# Altium footprint library my Library.PcbLib: 1247 footprints (part 13 of 78)
Each footprint in its own frame and in the unit in brackets; x right, y up, seen from the top. Pads: shape width x height; smd on the part's side, far side on the other; paste and mask are expansions set on the pad; w line width, h text height; cw(c..) or ccw(c..) is an arc to the next point about the centre after c.
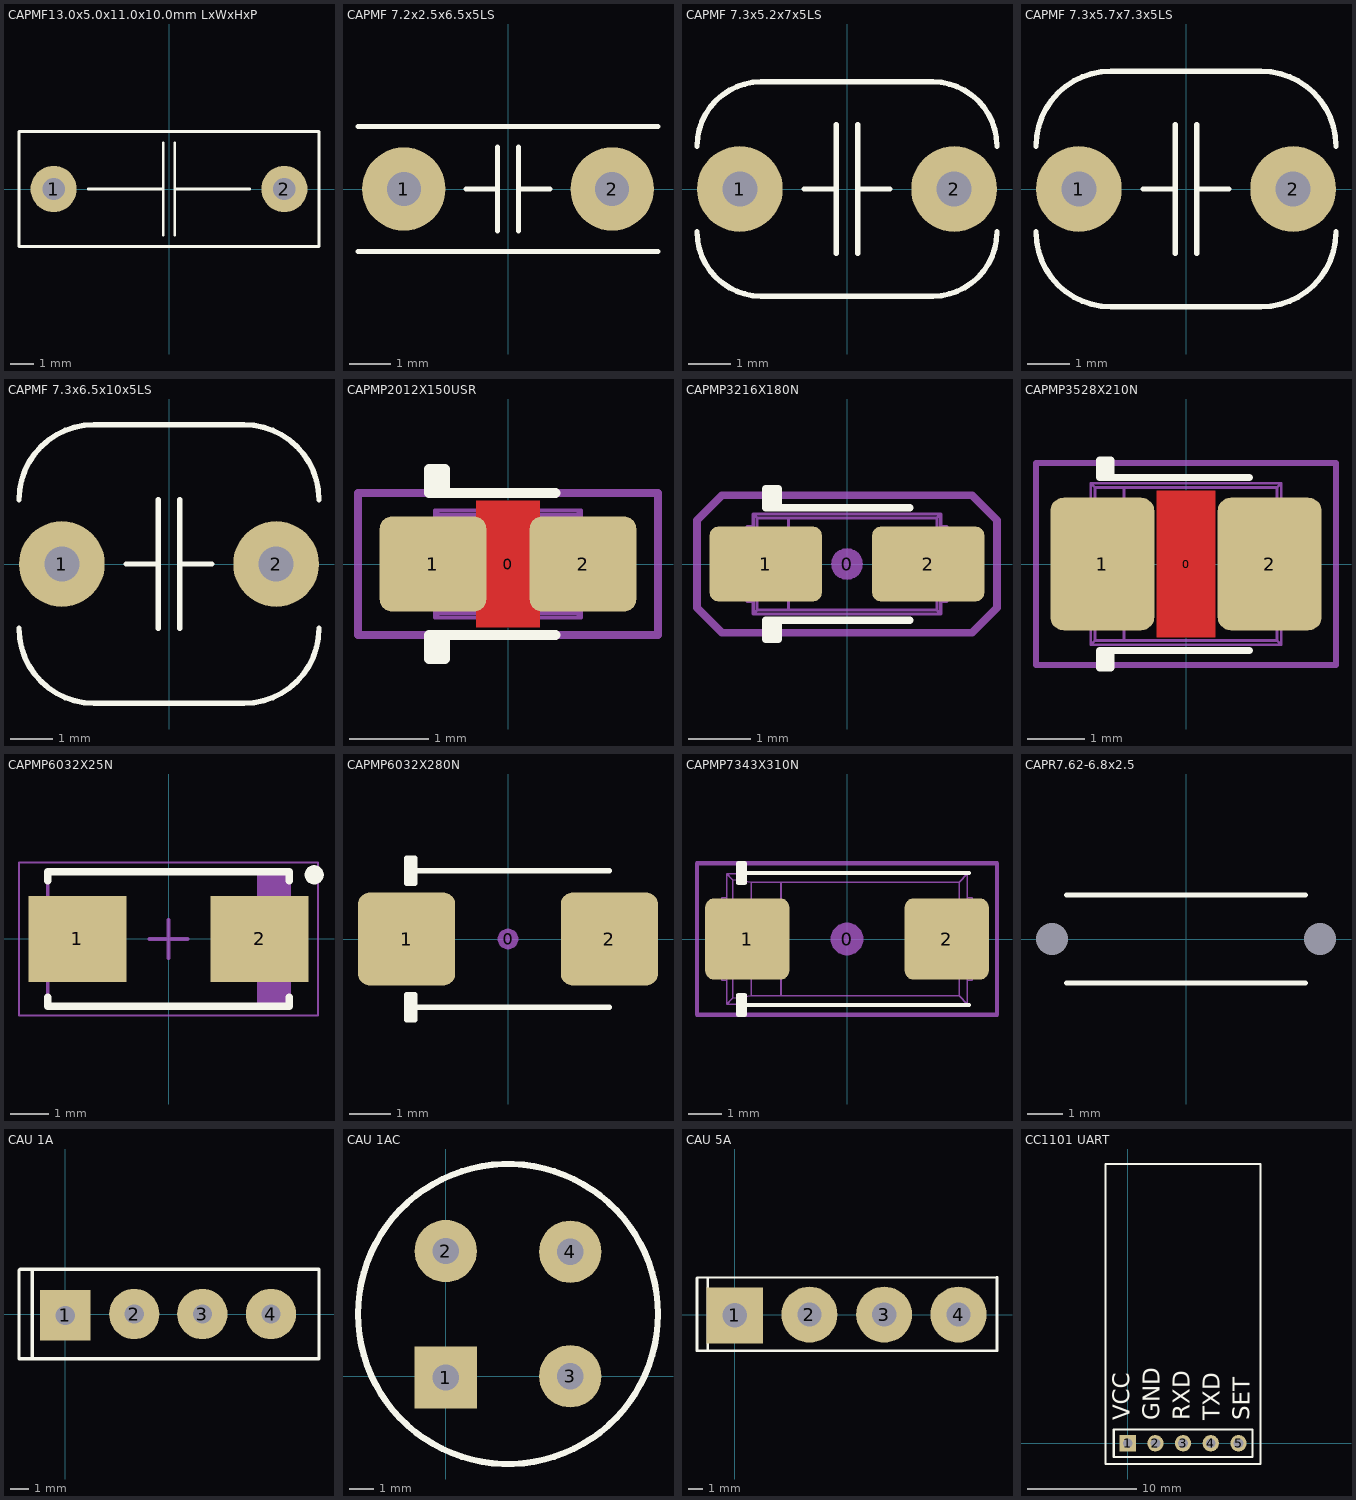
[diagram p12: the footprints below, top view; thin cyan lines are the x and y axes]

## CAPMF13.0x5.0x11.0x10.0mm LxWxHxP [mm] "Capacitor, THT, Metallized Polypropylene Film, 10mm lead pitch"
height 11
pads (2):
  round 2 hole 0.965: 1(-5,0) 2(5,0)
Top Overlay:
  lines w0.127: -3.5,0 -0.25,0 ; -0.25,-2 -0.25,2 ; 0.25,-2 0.25,2 ; 0.25,0 3.5,0 ; -6.5,-2.5 -6.5,2.5 6.5,2.5 6.5,-2.5 -6.5,-2.5
3D body: height 11, standoff 0, extent -6.5,-2.5 6.5,2.5

## CAPMF 7.2x2.5x6.5x5LS [mm] "Capacitor, THT, Metallized Polyester Film"
height 8.2
pads (2):
  round 2 hole 0.813: 1(-2.5,0) 2(2.5,0)
Top Overlay:
  lines w0.127: -3.6,-1.5 3.6,-1.5 ; -3.6,1.5 3.6,1.5 ; -1,0 -0.25,0 ; -0.25,-1 -0.25,1 ; 0.25,-1 0.25,1 ; 0.25,0 1,0
3D body "Cap, film, 7.2x2.5x6.5x5LS.STEP": height 7.5, standoff -2, extent -3.6,-1.25 3.6,1.25

## CAPMF 7.3x5.2x7x5LS [mm] "Capacitor, THT, Metallized Polyester Film"
height 7
pads (2):
  round 2 hole 0.813: 1(-2.5,0) 2(2.5,0)
Top Overlay:
  lines w0.127: -3.5,-1 ccw(c-2,-1) -2,-2.5 2,-2.5 ccw(c2,-1) 3.5,-1 ; -3.5,1 cw(c-2,1) -2,2.5 2,2.5 cw(c2,1) 3.5,1 ; -1,0 -0.25,0 ; -0.25,-1.5 -0.25,1.5 ; 0.25,-1.5 0.25,1.5 ; 0.25,0 1,0
3D body "Cap, film, 7.3x5.2x7x5LS.STP": height 8, standoff -2, extent -3.65,-2.6 3.65,2.6

## CAPMF 7.3x5.7x7.3x5LS [mm] "Capacitor, THT, Metallized Polyester Film"
height 7
pads (2):
  round 2 hole 0.813: 1(-2.5,0) 2(2.5,0)
Top Overlay:
  lines w0.127: -3.5,-1 ccw(c-1.75,-1) -1.75,-2.75 1.75,-2.75 ccw(c1.75,-1) 3.5,-1 ; -3.5,1 cw(c-1.75,1) -1.75,2.75 1.75,2.75 cw(c1.75,1) 3.5,1 ; -1,0 -0.25,0 ; -0.25,-1.5 -0.25,1.5 ; 0.25,-1.5 0.25,1.5 ; 0.25,0 1,0
3D body "Cap, film, 7.3x5.7x7.3x5LS.STP": height 8.3, standoff -2, extent -3.65,-2.85 3.65,2.85

## CAPMF 7.3x6.5x10x5LS [mm] "Capacitor, THT, Metallized Polyester Film"
height 10
pads (2):
  round 2 hole 0.813: 1(-2.5,0) 2(2.5,0)
Top Overlay:
  lines w0.127: -3.5,-1.5 ccw(c-1.75,-1.5) -1.75,-3.25 1.75,-3.25 ccw(c1.75,-1.5) 3.5,-1.5 ; -3.5,1.5 cw(c-1.75,1.5) -1.75,3.25 1.75,3.25 cw(c1.75,1.5) 3.5,1.5 ; -1,0 -0.25,0 ; -0.25,-1.5 -0.25,1.5 ; 0.25,-1.5 0.25,1.5 ; 0.25,0 1,0
3D body "Cap, film, 7.3x6.5x10x5LS.STP": height 11, standoff -2, extent -3.65,-3.25 3.65,3.25

## CAPMP2012X150USR [mm] "Molded body capacitor, Body 2.0x1.2mm, 0805, IPC Medium Density"
height 1.5
pads (3):
  round 0.254 on Mech15: 0(0,0)
  rrect25% 1.35x1.2 smd: 1(-0.95,0) 2(0.95,0)
Top Layer:
  pour cut-out: -0.4,0.8 0.4,0.8 0.4,-0.8 -0.4,-0.8
Top Overlay:
  lines w0.127: -0.9,-1.2 -0.9,-0.9 ; -0.9,0.9 -0.9,1.2 ; -0.8,-0.9 -0.8,-1.2 -1,-1.2 -1,-0.9 0.6,-0.9 ; -0.8,0.9 -0.8,1.2 -1,1.2 -1,0.9 0.6,0.9
Mechanical 13:
  lines w0.05: -1.025,-0.25 -0.925,-0.25 ; -1.025,0.25 -0.925,0.25 ; -0.925,-0.5 -1.025,-0.5 -1.025,0.5 -0.925,0.5 ; -0.373,-0.623 -0.373,0.623 ; 0.925,-0.5 1.025,-0.5 1.025,0.5 0.925,0.5 ; 0.925,-0.25 1.025,-0.25 ; 0.925,0.25 1.025,0.25 ; -0.925,-0.675 0.925,-0.675 ; -0.925,-0.675 -0.925,0.675 ; -0.925,-0.675 -0.873,-0.623 ; -0.925,0.675 0.925,0.675 ; -0.925,0.675 -0.873,0.623 ; -0.873,-0.623 0.873,-0.623 ; -0.873,-0.623 -0.873,0.623 ; -0.873,0.623 0.873,0.623 ; 0.873,-0.623 0.925,-0.675 ; 0.873,-0.623 0.873,0.623 ; 0.873,0.623 0.925,0.675 ; 0.925,-0.675 0.925,0.675
Mechanical 15:
  lines w0.1: -1.9,-0.9 1.9,-0.9 1.9,0.9 -1.9,0.9 -1.9,-0.9
3D body "CAPMP2012X150N.STEP": height 1.5, standoff 0, extent -1.025,-0.675 1.025,0.675

## CAPMP3216X180N [mm] "Capacitor, polarized, Molded Body, EIA 535BAAC size A; 3.20mm L X 1.60mm W X 1.80mm H"
height 1.8
pads (3):
  round 0.508 on Mech15: 0(0,0)
  rrect25% 1.8x1.2 smd: 1(-1.3,0) 2(1.3,0)
Top Overlay:
  lines w0.127: -1.2,-1.2 -1.2,-0.9 ; -1.2,0.9 -1.2,1.2 ; -1.1,-0.9 -1.1,-1.2 -1.3,-1.2 -1.3,-0.9 1,-0.9 ; -1.1,0.9 -1.1,1.2 -1.3,1.2 -1.3,0.9 1,0.9
Mechanical 13:
  lines w0.05: -1.6,-0.36 -1.499,-0.36 ; -1.6,0.36 -1.499,0.36 ; -1.499,-0.6 -1.6,-0.6 -1.6,0.6 -1.499,0.6 ; -0.937,-0.737 -0.937,0.737 ; 1.499,-0.6 1.6,-0.6 1.6,0.6 1.499,0.6 ; 1.499,-0.36 1.6,-0.36 ; 1.499,0.36 1.6,0.36 ; -1.5,-0.8 -1.437,-0.737 ; -1.5,-0.8 1.5,-0.8 ; -1.5,-0.8 -1.5,0.8 ; -1.5,0.8 -1.437,0.737 ; -1.5,0.8 1.5,0.8 ; -1.437,-0.737 1.437,-0.737 ; -1.437,-0.737 -1.437,0.737 ; -1.437,0.737 1.437,0.737 ; 1.437,-0.737 1.5,-0.8 ; 1.437,-0.737 1.437,0.737 ; 1.437,0.737 1.5,0.8 ; 1.5,-0.8 1.5,0.8
Mechanical 15:
  lines w0.127: -2.4,-0.7 -2.4,0.7 -2,1.1 2,1.1 2.4,0.7 2.4,-0.7 2,-1.1 -2,-1.1 -2.4,-0.7
3D body "CAPMP3216X180N.STEP": height 1.8, standoff 0, extent -1.6,-0.8 1.6,0.8

## CAPMP3528X210N [mm] "Molded body capacitor, Body 3.5x2.8mm, 1210, IPC Nominal settings"
height 2.1
pads (3):
  round 0.254 on Mech15: 0(0,0)
  rrect25% 1.8x2.3 smd: 1(-1.45,0) 2(1.45,0)
Top Layer:
  pour cut-out: -0.508,1.27 0.508,1.27 0.508,-1.27 -0.508,-1.27
Top Overlay:
  lines w0.127: -1.4,-1.8 -1.4,-1.5 ; -1.4,1.5 -1.4,1.8 ; -1.3,-1.5 -1.3,-1.8 -1.5,-1.8 -1.5,-1.5 1.1,-1.5 ; -1.3,1.5 -1.3,1.8 -1.5,1.8 -1.5,1.5 1.1,1.5
Mechanical 13:
  lines w0.05: -1.75,-0.55 -1.65,-0.55 ; -1.75,0.55 -1.65,0.55 ; -1.65,-1.1 -1.75,-1.1 -1.75,1.1 -1.65,1.1 ; -1.077,-1.327 -1.077,1.327 ; 1.65,-1.1 1.75,-1.1 1.75,1.1 1.65,1.1 ; 1.65,-0.55 1.75,-0.55 ; 1.65,0.55 1.75,0.55 ; -1.65,-1.4 1.65,-1.4 ; -1.65,-1.4 -1.65,1.4 ; -1.65,-1.4 -1.577,-1.327 ; -1.65,1.4 1.65,1.4 ; -1.65,1.4 -1.577,1.327 ; -1.577,-1.327 1.577,-1.327 ; -1.577,-1.327 -1.577,1.327 ; -1.577,1.327 1.577,1.327 ; 1.577,-1.327 1.65,-1.4 ; 1.577,-1.327 1.577,1.327 ; 1.577,1.327 1.65,1.4 ; 1.65,-1.4 1.65,1.4
Mechanical 15:
  lines w0.1: -2.6,-1.75 2.6,-1.75 2.6,1.75 -2.6,1.75 -2.6,-1.75
3D body "CAPMP3528X210N.STEP": height 2.1, standoff 0, extent -1.75,-1.4 1.75,1.4

## CAPMP6032X25N [mm] "Molded Capacitor, 2-Leads, Body 6.00x3.20mm, IPC Medium Density"
height 2.5
pads (2):
  rect 2.55x2.25 smd: 1(-2.375,0) 2(2.375,0)
Top Overlay:
  circle w0.25: c3.8,1.675 r0.125
  lines w0.2: -3.15,-1.525 -3.15,-1.75 3.15,-1.75 3.15,-1.525 ; -3.15,1.525 -3.15,1.75 3.15,1.75 3.15,1.525
Mechanical 13:
  rectangle: 2.303,-1.75 3.15,1.75
  lines w0.1: -3.15,-1.75 3.15,-1.75 3.15,1.75 -3.15,1.75 -3.15,-1.75
Mechanical 15:
  lines w0.05: -3.9,-2 3.9,-2 3.9,2 -3.9,2 -3.9,-2
  lines w0.1: -0.5,0 0.5,0 ; 0,-0.5 0,0.5
3D body "CAPMP6032X25N.step": height 2.5, standoff 0, extent -3.37,-1.75 3.37,1.75

## CAPMP6032X280N [mm] "Capacitor, polarized, Molded Body, EIA 535BAAC size C; 6.00mm L X 3.20mm W X 2.80mm H"
height 2.8
pads (3):
  round 0.508 on Mech15: 0(0,0)
  rrect25% 2.35x2.25 smd: 1(-2.45,0) 2(2.45,0)
Top Overlay:
  lines w0.127: -2.45,-1.65 2.45,-1.65 ; -2.45,1.65 2.45,1.65 ; -2.35,-1.95 -2.35,-1.65 -2.35,-1.35 ; -2.35,1.35 -2.35,1.65 -2.35,1.95 ; -2.45,-1.95 -2.25,-1.95 -2.25,-1.65 -2.25,-1.35 -2.45,-1.35 -2.45,-1.95 ; -2.45,1.35 -2.25,1.35 -2.25,1.65 -2.25,1.95 -2.45,1.95 -2.45,1.35
3D body: height 2.8, standoff 0, extent -3,-1.6 3,1.6

## CAPMP7343X310N [mm] "Molded body capacitor, Body 7.3x4.3mm, 2917, IPC Nominal settings"
height 3.1
pads (3):
  round 1 on Mech15: 0(0,0)
  rrect20% 2.55x2.45 smd: 1(-3.025,0) 2(3.025,0)
Top Overlay:
  lines w0.127: -3.3,-2 3.7,-2 ; -3.3,2 3.7,2 ; -3.2,-2.3 -3.2,-2 -3.2,-1.7 ; -3.2,1.7 -3.2,2 -3.2,2.3 ; -3.3,-2.3 -3.1,-2.3 -3.1,-2 -3.1,-1.7 -3.3,-1.7 -3.3,-2.3 ; -3.3,1.7 -3.1,1.7 -3.1,2 -3.1,2.3 -3.3,2.3 -3.3,1.7
Mechanical 13:
  lines w0.05: -3.8,-0.5 -3.65,-0.5 ; -3.8,0.5 -3.65,0.5 ; -3.67,-0.5 -3.67,0.5 ; -3.65,-1.25 -3.8,-1.25 -3.8,1.25 -3.65,1.25 ; -2.901,-0.575 -2.901,0.575 ; 3.65,-1.25 3.8,-1.25 3.8,1.25 3.65,1.25 ; 3.65,-0.5 3.8,-0.5 ; 3.65,0.5 3.8,0.5 ; 3.67,-0.5 3.67,0.5 ; -3.65,-1.975 3.65,-1.975 ; -3.65,-1.975 -3.471,-1.796 ; -3.65,-1.975 -3.65,1.975 ; -3.65,1.975 -3.471,1.796 ; -3.65,1.975 3.65,1.975 ; -3.471,-1.796 -2.907,-1.727 ; -3.471,-1.796 -3.471,1.796 ; -3.471,1.796 -2.907,1.727 ; -2.907,-1.727 -2.001,-1.727 ; -2.907,-1.727 -2.907,-0.575 -2.001,-0.575 -2.001,-1.727 ; -2.907,1.727 -2.001,1.727 ; -2.907,1.727 -2.907,0.575 -2.001,0.575 -2.001,1.727 ; -2.001,-1.727 3.401,-1.726 ; -2.001,1.727 3.401,1.726 ; 3.401,-1.726 3.65,-1.975 ; 3.401,-1.726 3.401,1.726 ; 3.401,1.726 3.65,1.975 ; 3.65,-1.975 3.65,1.975
Mechanical 15:
  lines w0.127: -4.55,-2.3 4.55,-2.3 4.55,2.3 -4.55,2.3 -4.55,-2.3
3D body "CAPMP7343X310N.STEP": height 3.1, standoff 0, extent -3.8,-1.975 3.8,1.975

## CAPR7.62-6.8x2.5 [mil] "Capacitor, MF, Thru-Hole, Dipped Radial; Body 6.8 x 2.5 mm (WxT) Pin Spacing 7.62 mm (typ)"
height 236.22
pads (2):
  round 0 / inner round 0 / far side oval 100x85 hole 36 unplated: 1(-150,0) 2(150,0)
Top Overlay:
  lines w6: -133.86,-49.21 133.86,-49.21 ; -133.86,49.21 133.86,49.21
3D body "CAPMF_10.3x6.0x13.0mm WxTxH 7.5mmLS.STEP": height 511.81, standoff -100, extent -202.75,-118.1 202.76,118.12

## CAU 1A [mil] "CAU 1A DET"
height 800
pads (4):
  rect 110x110 hole 42: 1(0,-2)
  round 110 hole 42: 2(151,1) 3(300,1) 4(450,1)
Top Overlay:
  lines w7: -72,-95 -72,99 ; -101,-97 -101,97 -99,99 555,99 555,-97 -101,-97
3D body "SW3dPS-KBPM.STEP": height 453.36, standoff -499.4, extent -61.99,-90 511.99,107.24

## CAU 1AC [mil] "CAU 1A TRON"
height 800
pads (4):
  rect 100x100 hole 42: 1(0,-2)
  round 100 hole 42: 2(0,201) 3(200,0) 4(200,200)
Top Overlay:
  circle w10: c100,100 r240.88
3D body: height 260, standoff 60, extent -136,-139 342.11,340.05
3D body: height 140, standoff -60, extent -17.93,-20.93 17.93,15
3D body: height 140, standoff -60, extent 182.07,-18.93 217.93,17
3D body: height 140, standoff -60, extent 182.07,181.07 217.93,217
3D body: height 140, standoff -60, extent -17.93,182.07 17.93,218
3D body: height 270, standoff 250, extent -29.57,168.24 25.59,241.07
3D body: height 270, standoff 250, extent 171.79,-36.7 226.94,36.13
3D body: height 270, standoff 250, extent -40.31,-44.97 39.6,34.23
3D body: height 270, standoff 250, extent 152.98,152.98 231.47,231.47

## CAU 5A [mil] "CAU 5A DET"
height 800
pads (4):
  rect 150x150 hole 65: 1(0,-2)
  round 150 hole 65: 2(200,0) 3(400,0) 4(599,0)
Top Overlay:
  lines w7: -72,-95 -72,99 ; -101,-97 702,-97 702,100 -99,99 -101,97 -101,-97
3D body "SW3dPS-bridge 2.STEP": height 820.68, standoff -621.62, extent -138.98,-105 738.98,43.03

## CC1101 UART [mm] "Connector; Header; 5 Position"
height 1.14
pads (5):
  rect 1.5x1.5 hole 0.9: 1(0,0)
  round 1.5 hole 0.9: 2(2.54,0) 3(5.08,0) 4(7.62,0) 5(10.16,0)
Top Overlay:
  lines w0.178: -2.032,-1.905 12.192,-1.905 12.192,25.595 -2.032,25.595 -2.032,-1.905
  lines w0.2: -1.27,-1.27 -1.27,1.27 11.43,1.27 11.43,-1.27 -1.27,-1.27
  text "VCC" at 0.2,2.087 h1.52
  text "GND" at 2.95,2.087 h1.52
  text "RXD" at 5.7,2.087 h1.52
  text "TXD" at 8.45,2.087 h1.52
  text "SET" at 11.2,2.087 h1.52
3D body "female_header_a-bl254-eg-g05d.stp": height 8.52, standoff -3.18, extent -1.382,-1.257 11.568,1.243